# Altium footprint library M_Derogarian Altium Library.PcbLib: 137 footprints (part 9 of 9)
Each footprint in its own frame and in the unit in brackets; x right, y up, seen from the top. Pads: shape width x height; smd on the part's side, far side on the other; paste and mask are expansions set on the pad; w line width, h text height; cw(c..) or ccw(c..) is an arc to the next point about the centre after c.
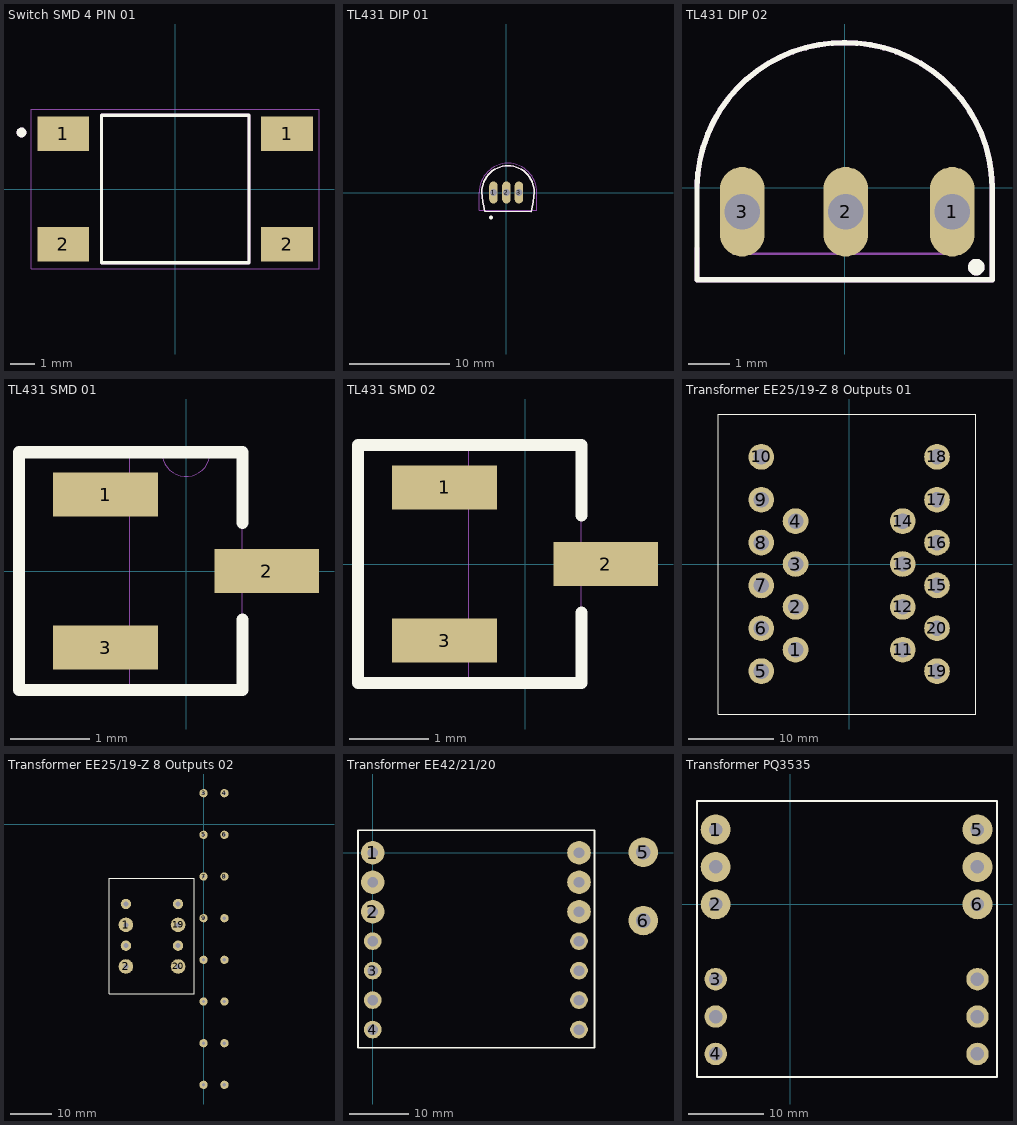
[diagram p8: the footprints below, top view; thin cyan lines are the x and y axes]

## Switch SMD 4 PIN 01 [mm]
pads (4):
  rect 2.1x1.4 smd: 1(-4.55,2.25) 1(4.55,2.25) 2(-4.55,-2.25) 2(4.55,-2.25)
Top Overlay:
  circle w0.2: c-6.25,2.3 r0.1
  lines w0.127: -3,-3 -3,3 3,3 3,-3 -3,-3
Mechanical 13:
  circle w0.2: c-6.25,2.3 r0.1
  lines w0.127: -3,-3 3,-3 3,3 -3,3 -3,-3
Mechanical 15:
  lines w0.05: -5.85,-3.25 5.85,-3.25 5.85,3.25 -5.85,3.25 -5.85,-3.25
3D body "4-1437565-2.stp": height 5, standoff -0.07, extent -5.178,-3.15 4.822,2.85

## TL431 DIP 01 [mm]
pads (3):
  oval 0.85x2.2 hole 0.7: 1(-1.27,0) 2(0.025,0) 3(1.27,0)
Top Overlay:
  circle w0.2: c-1.524,-2.489 r0.1
  lines w0.127: -2.428,0.043 ccw(c6.356,0.349) -2.152,-1.859 ; -2.427,-0.004 cw(c0.21,0.042) 0.164,2.679 ; -2.134,-1.892 2.489,-1.905 ; 0.191,2.679 cw(c0.145,0.042) 2.783,-0.004 ; 2.497,-1.9 ccw(c-6,0.349) 2.784,0.043
Mechanical 13:
  lines w0.127: -2.428,0.043 ccw(c6.356,0.349) -2.152,-1.859 ; -2.427,-0.004 cw(c0.21,0.042) 0.164,2.679 ; -2.108,-1.892 2.464,-1.905 ; 0.191,2.679 cw(c0.145,0.042) 2.783,-0.004 ; 2.501,-1.883 ccw(c-6,0.349) 2.784,0.043
Mechanical 15:
  lines w0.05: -2.677,-0.009 cw(c0.21,0.042) 0.16,2.929 ; -2.677,0.009 -2.677,-1.761 3.033,-1.761 3.033,0.009 ; 0.196,2.929 cw(c0.145,0.042) 3.033,-0.009
3D body "step_temp.STEP": height 7.84, standoff -10.2, extent -2.412,-1.369 2.413,2.311

## TL431 DIP 02 [mm]
height 7.35
pads (3):
  oval 1.07x2.14 hole 0.85: 1(2.575,-0.575) 2(0.025,-0.575) 3(-2.45,-0.575)
Top Overlay:
  circle w0.2: c3.15,-1.9 r0.1
  lines w0.127: -0.03,3.468 cw(c0.031,-0.031) 3.531,0.03 ; 0.03,3.468 ccw(c-0.031,-0.031) -3.531,0.03 -3.531,-0.281 -3.531,-2.2 3.531,-2.2 3.531,0.03
Mechanical 13:
  circle w0.2: c3.15,-1.9 r0.1
  lines w0.127: -3.531,-2.2 -3.531,-1.453 ; -3.531,0.03 cw(c-0.031,-0.031) 0.03,3.468 ; -3.475,-2.2 3.531,-2.2 3.531,0.03 ; -0.03,3.468 cw(c0.031,-0.031) 3.531,0.03 ; 3.531,-0.019 3.531,0
Mechanical 15:
  lines w0.05: -3.531,0.03 cw(c-0.031,-0.031) 0.03,3.468 ; -2.662,0 -2.662,-1.58 2.662,-1.58 2.662,0 ; -0.061,3.468 cw(c0,-0.031) 3.5,0
3D body "step_temp.STEP": height 9.34, standoff -8.7, extent -2.757,-1.855 2.907,1.825

## TL431 SMD 01 [mil]
pads (3):
  rect 52x22 smd: 1(-40,38) 2(40,0) 3(-40,-38)
Top Overlay:
  lines w6: 28,-24 28,-59 -83,-59 -83,59 12,59 28,59 28,24
Mechanical 13:
  lines w0: -28,-48 -28,-59 28,-59 28,-10 ; -28,-48 -28,-28 ; -28,-48 -49,-48 -49,-28 -28,-28 ; -28,-28 -28,28 ; -28,28 -28,48 ; -28,28 -49,28 -49,48 -28,48 ; -28,48 -28,59 -12,59 ; -12,59 ccw(c0,59) 12,59 ; -12,59 12,59 ; 12,59 28,59 28,10 ; 28,-10 28,10 ; 28,-10 49,-10 49,10 28,10
3D body "step_temp.STEP": height 47.24, standoff -3.94, extent -52.36,-59.84 50,59.84

## TL431 SMD 02 [mil]
pads (3):
  rect 52x22 smd: 1(-40,38) 2(40,0) 3(-40,-38)
Top Overlay:
  lines w6: 28,-24 28,-59 -83,-59 -83,59 12,59 28,59 28,24
Mechanical 13:
  lines w0: -28,-48 -28,-59 28,-59 28,-10 ; -28,-48 -28,-28 ; -28,-48 -49,-48 -49,-28 -28,-28 ; -28,-28 -28,28 ; -28,28 -28,48 ; -28,28 -49,28 -49,48 -28,48 ; -28,48 -28,59 -12,59 12,59 28,59 28,10 ; 28,-10 28,10 ; 28,-10 49,-10 49,10 28,10
3D body "User Library-SOT-23W.STEP": height 51.97, standoff 0, extent -58.31,-59.96 59.8,59.72

## Transformer EE25/19-Z 8 Outputs 01 [mm]
pads (20):
  round 3 hole 1.8: 1(-6.25,-10) 2(-6.25,-5) 3(-6.25,0) 4(-6.25,5) 5(-10.25,-12.5) 6(-10.25,-7.5) 7(-10.25,-2.5) 8(-10.25,2.5) 9(-10.25,7.5) 10(-10.25,12.5) 11(6.25,-10) 12(6.25,-5) 13(6.25,0) 14(6.25,5) 15(10.25,-2.5) 16(10.25,2.5) 17(10.25,7.5) 18(10.25,12.5) 19(10.25,-12.5) 20(10.25,-7.5)
Top Overlay:
  lines w0.1: -15.25,-17.5 -15.25,17.5 ; 14.75,-17.5 14.75,17.5
  lines w0.127: -15.25,-17.5 14.75,-17.5 ; -15.25,17.5 14.75,17.5
3D body "User Library-POL-24208.STEP": height 21, standoff -5.5, extent -9.236,-15.64 9.564,10.36
3D body "70373408.stp": height 7.32, standoff -11.73, extent 7.366,-15.117 13.716,15.113
3D body "70373408.stp": height 7.32, standoff -11.73, extent -13.462,-14.859 -7.112,15.371

## Transformer EE25/19-Z 8 Outputs 02 [mm]
pads (24):
  round 3.5 hole 1.2: 1(-18.63,-24.098) 2(-18.63,-34.098) 19(-6.13,-24.098) 20(-6.13,-34.098)
  round 2 hole 0.8: 3(0,7.5) 4(5,7.5) 5(0,-2.5) 6(5,-2.5) 7(0,-12.5) 8(5,-12.5) 9(0,-22.5) 10(5,-22.5) 11(0,-32.5) 12(5,-32.5) 13(0,-42.5) 14(5,-42.5) 15(0,-52.5) 16(5,-52.5) 17(0,-62.5) 18(5,-62.5)
  round 2.5 hole 1.2: ""(-18.63,-29.098) ""(-18.63,-19.098) ""(-6.13,-29.098) ""(-6.13,-19.098)
Top Overlay:
  lines w0.1: -22.6,-40.622 -22.6,-12.972 ; -2.2,-40.622 -2.2,-12.972
  lines w0.127: -22.6,-40.622 -2.2,-40.622 ; -22.6,-12.972 -2.2,-12.972
3D body "User Library-POL-24208.STEP": height 21, standoff -5.5, extent -21.616,-39.738 -2.816,-13.738

## Transformer EE42/21/20 [mm]
pads (16):
  round 4 hole 1.8: 1(0,0) 2(0,-10) ""(0,-5) ""(35,-10) ""(35,-5) ""(35,0)
  round 3 hole 1.8: 3(0,-20) 4(0,-30) ""(0,-25) ""(0,-15) ""(35,-15) ""(35,-30) ""(35,-25) ""(35,-20)
  round 5 hole 2.5: 5(45.9,0.1) 6(45.9,-11.5)
Top Overlay:
  lines w0.3: -2.497,-33.089 37.61,-33.089 37.61,3.818 -2.497,3.818 -2.497,-33.089
3D body "User Library-EER42_Transformer.STEP": height 33.24, standoff -3.01, extent -4.3,-38.9 37.9,3.3

## Transformer PQ3535 [mm]
pads (12):
  round 4 hole 1.8: 1(-10,10) 2(-10,0) 5(25,10) 6(25,0) ""(-10,5) ""(25,5)
  round 3 hole 1.8: 3(-10,-10) 4(-10,-20) ""(-10,-15) ""(25,-20) ""(25,-15) ""(25,-10)
Top Overlay:
  lines w0.3: -12.497,-23.089 27.61,-23.089 27.61,13.818 -12.497,13.818 -12.497,-23.089
3D body "User Library-PQ3535.STEP": height 5, standoff -35, extent -12.032,-22.655 26.968,12.445